# Altium footprint library Gate Driver Board.PcbLib: 123 footprints (part 1 of 8)
Each footprint in its own frame and in the unit in brackets; x right, y up, seen from the top. Pads: shape width x height; smd on the part's side, far side on the other; paste and mask are expansions set on the pad; w line width, h text height; cw(c..) or ccw(c..) is an arc to the next point about the centre after c.
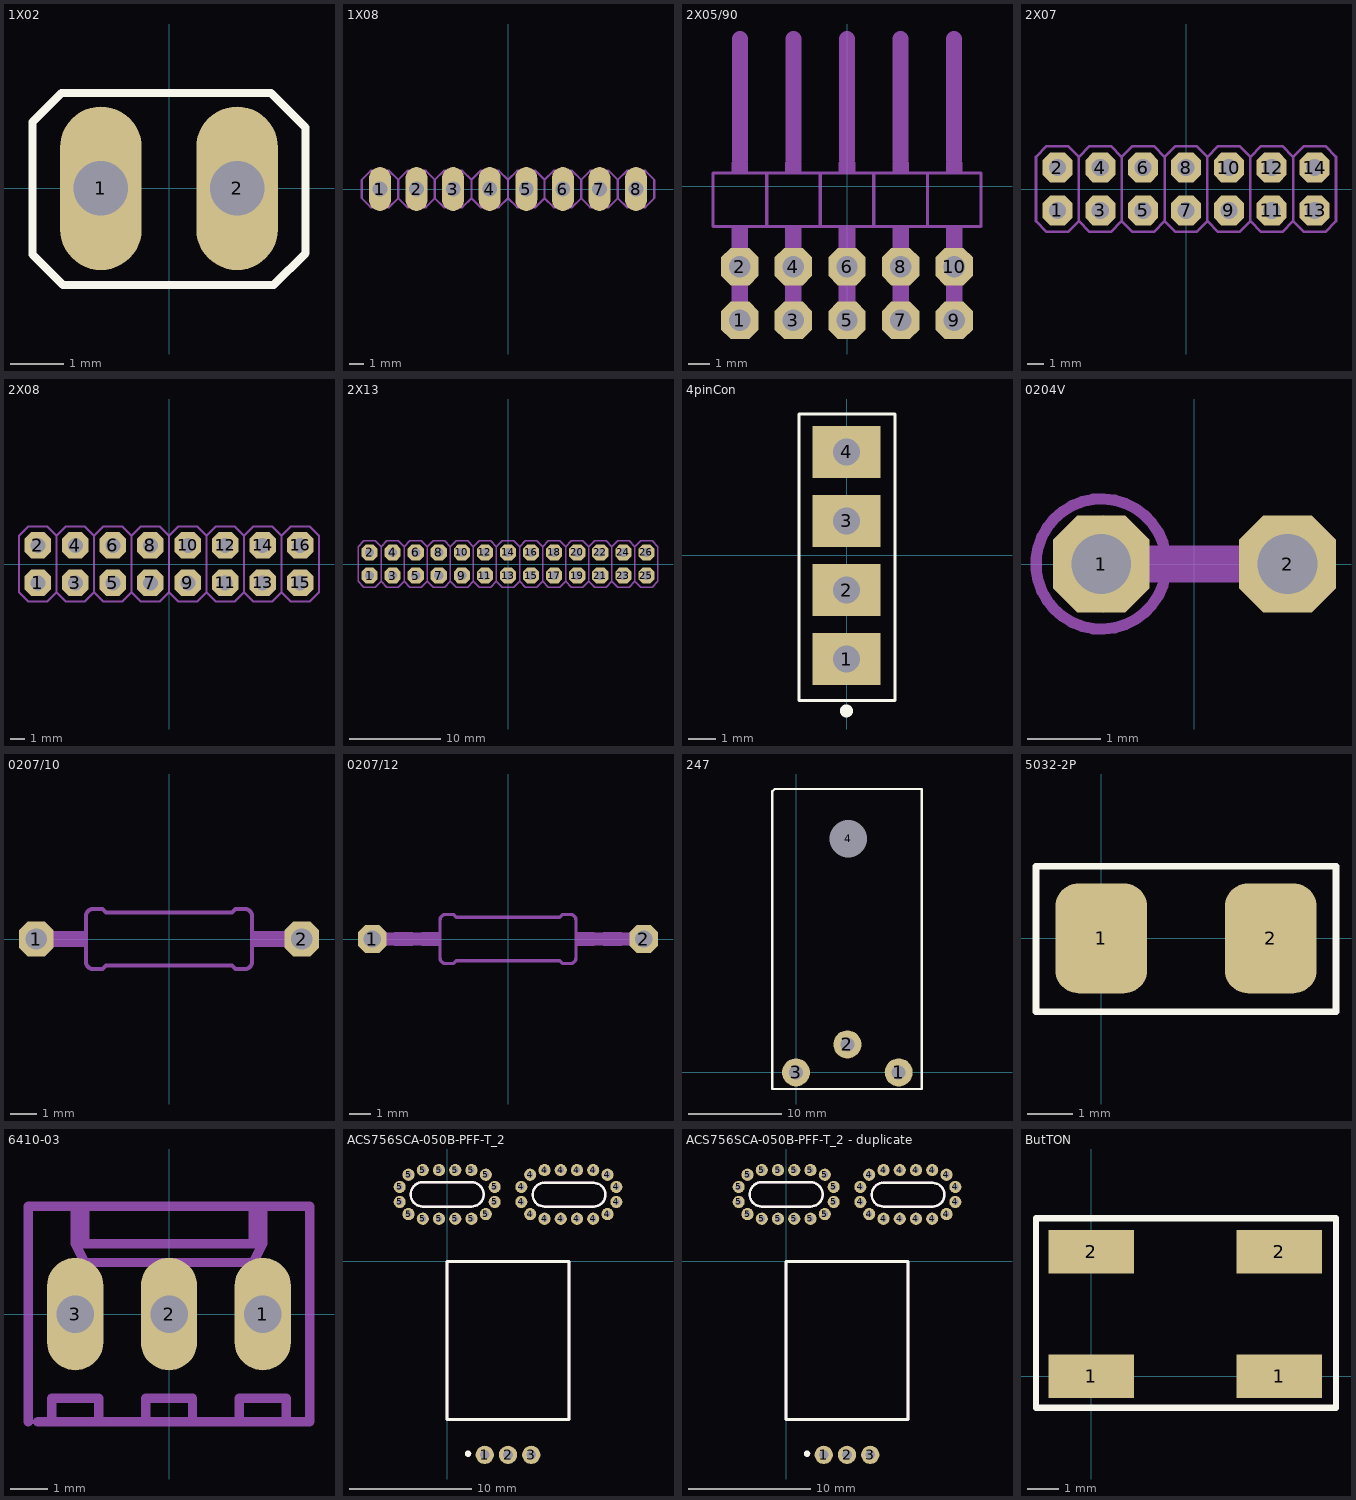
[diagram p0: the footprints below, top view; thin cyan lines are the x and y axes]

## 1X02 [mil] "1X02"
pads (2):
  oval 60x120 / inner round 0 / far side oval 60x120 hole 40: 1(-50,0) 2(50,0)
Top Overlay:
  lines w6: -100,-48.62 -100,48.62 -78.74,69.88 74.8,69.88 100,44.69 100,-47.64 76.77,-70.87 -65.94,-70.87 -77.76,-70.87 -100,-48.62
Assembly Bottom:
  region: -60,-10 -60,10 -40,10 -40,-10
  region: 40,-10 40,10 60,10 60,-10
3D body: height 150, standoff 0, extent -60,-10 -40,10
3D body: height 150, standoff 0, extent 40,-10 60,10
3D body: height 50, standoff 0, extent -80.26,-60.26 -19.74,60.26
3D body: height 50, standoff 0, extent 19.74,-60.26 80.26,60.26

## 1X08 [mil] "1X08"
pads (8):
  oval 60x120 / inner round 0 / far side oval 60x120 hole 40: 1(-350,0) 2(-250,0) 3(-150,0) 4(-50,0) 5(50,0) 6(150,0) 7(250,0) 8(350,0)
Assembly Bottom:
  region: 340,-10 340,10 360,10 360,-10
  region: -360,-10 -360,10 -340,10 -340,-10
  region: -260,-10 -260,10 -240,10 -240,-10
  region: -160,-10 -160,10 -140,10 -140,-10
  region: -60,-10 -60,10 -40,10 -40,-10
  region: 40,-10 40,10 60,10 60,-10
  region: 140,-10 140,10 160,10 160,-10
  region: 240,-10 240,10 260,10 260,-10
3D Body Bottom:
  lines w6: -300,-25 -275,-50 -225,-50 -200,-25 ; -300,-25 -325,-50 -375,-50 -400,-25 -400,25 -375,50 -325,50 -300,25 ; -300,-25 -300,25 ; -300,25 -275,50 -225,50 -200,25 ; -200,-25 -200,25 ; -200,-25 -175,-50 -125,-50 -100,-25 ; -200,25 -175,50 -125,50 -100,25 ; -100,-25 -75,-50 -25,-50 0,-25 ; -100,-25 -100,25 ; -100,25 -75,50 -25,50 0,25 ; 0,-25 25,-50 75,-50 100,-25 ; 0,-25 0,25 ; 0,25 25,50 75,50 100,25 ; 100,-25 100,25 ; 100,-25 125,-50 175,-50 200,-25 ; 100,25 125,50 175,50 200,25 ; 200,-25 225,-50 275,-50 300,-25 ; 200,-25 200,25 ; 200,25 225,50 275,50 300,25 ; 300,-25 325,-50 375,-50 400,-25 400,25 375,50 325,50 300,25 ; 300,-25 300,25
3D body: height 50, standoff 0, extent 319.74,-60.26 380.26,60.26
3D body: height 50, standoff 0, extent 219.74,-60.26 280.26,60.26
3D body: height 50, standoff 0, extent 119.74,-60.26 180.26,60.26
3D body: height 50, standoff 0, extent 19.74,-60.26 80.26,60.26
3D body: height 50, standoff 0, extent -80.26,-60.26 -19.74,60.26
3D body: height 50, standoff 0, extent -180.26,-60.26 -119.74,60.26
3D body: height 50, standoff 0, extent -280.26,-60.26 -219.74,60.26
3D body: height 50, standoff 0, extent -380.26,-60.26 -319.74,60.26
3D body: height 150, standoff 0, extent 340,-10 360,10
3D body: height 150, standoff 0, extent -360,-10 -340,10
3D body: height 150, standoff 0, extent -260,-10 -240,10
3D body: height 150, standoff 0, extent -160,-10 -140,10
3D body: height 150, standoff 0, extent -60,-10 -40,10
3D body: height 150, standoff 0, extent 40,-10 60,10
3D body: height 150, standoff 0, extent 140,-10 160,10
3D body: height 150, standoff 0, extent 240,-10 260,10

## 2X05/90 [mil] "2X05/90"
pads (10):
  oct 70x70 / inner round 0 / far side oct 70x70 hole 40: 1(-200,-250) 2(-200,-150) 3(-100,-250) 4(-100,-150) 5(0,-250) 6(0,-150) 7(100,-250) 8(100,-150) 9(200,-250) 10(200,-150)
Assembly Bottom:
  region: 185,-185 185,-115 215,-115 215,-185
  region: 85,-185 85,-115 115,-115 115,-185
  region: -15,-185 -15,-115 15,-115 15,-185
  region: -115,-185 -115,-115 -85,-115 -85,-185
  region: -215,-185 -215,-115 -185,-115 -185,-185
3D Body Bottom:
  region: 185,-215 185,-185 215,-185 215,-215
  region: 185,-115 185,-75 215,-75 215,-115
  region: 85,-215 85,-185 115,-185 115,-215
  region: -15,-215 -15,-185 15,-185 15,-215
  region: 85,-115 85,-75 115,-75 115,-115
  region: -15,-115 -15,-75 15,-75 15,-115
  region: -115,-215 -115,-185 -85,-185 -85,-215
  region: -215,-215 -215,-185 -185,-185 -185,-215
  region: -115,-115 -115,-75 -85,-75 -85,-115
  region: -215,-115 -215,-75 -185,-75 -185,-115
  region: 185,25 185,45 215,45 215,25
  region: 85,25 85,45 115,45 115,25
  region: -15,25 -15,45 15,45 15,25
  region: -115,25 -115,45 -85,45 -85,25
  region: -215,25 -215,45 -185,45 -185,25
  lines w6: -150,-75 -50,-75 ; -150,-75 -150,25 ; -150,-75 -250,-75 -250,25 -150,25 ; -150,25 -50,25 ; -50,-75 50,-75 ; -50,-75 -50,25 ; -50,25 50,25 ; 50,-75 150,-75 ; 50,-75 50,25 ; 50,25 150,25 ; 150,-75 250,-75 250,25 150,25 ; 150,-75 150,25
  lines w30: -200,50 -200,275 ; -100,50 -100,275 ; 0,50 0,275 ; 100,50 100,275 ; 200,50 200,275

## 2X07 [mil] "2X07"
pads (14):
  oct 70x70 / inner round 0 / far side oct 70x70 hole 40: 1(-300,-50) 2(-300,50) 3(-200,-50) 4(-200,50) 5(-100,-50) 6(-100,50) 7(0,-50) 8(0,50) 9(100,-50) 10(100,50) 11(200,-50) 12(200,50) 13(300,-50) 14(300,50)
Assembly Bottom:
  region: 290,-60 290,-40 310,-40 310,-60
  region: 290,40 290,60 310,60 310,40
  region: 190,-60 190,-40 210,-40 210,-60
  region: 90,-60 90,-40 110,-40 110,-60
  region: -10,-60 -10,-40 10,-40 10,-60
  region: 190,40 190,60 210,60 210,40
  region: 90,40 90,60 110,60 110,40
  region: -10,40 -10,60 10,60 10,40
  region: -110,-60 -110,-40 -90,-40 -90,-60
  region: -110,40 -110,60 -90,60 -90,40
  region: -210,-60 -210,-40 -190,-40 -190,-60
  region: -210,40 -210,60 -190,60 -190,40
  region: -310,40 -310,60 -290,60 -290,40
  region: -310,-60 -310,-40 -290,-40 -290,-60
3D Body Bottom:
  lines w6: -250,-75 -250,75 ; -250,-75 -225,-100 -175,-100 -150,-75 ; -250,-75 -275,-100 -325,-100 -350,-75 -350,75 -325,100 -275,100 -250,75 ; -250,75 -225,100 -175,100 -150,75 ; -150,-75 -150,75 ; -150,-75 -125,-100 -75,-100 -50,-75 ; -150,75 -125,100 -75,100 -50,75 ; -50,-75 -50,75 ; -50,-75 -25,-100 25,-100 50,-75 ; -50,75 -25,100 25,100 50,75 ; 50,-75 50,75 ; 50,-75 75,-100 125,-100 150,-75 ; 50,75 75,100 125,100 150,75 ; 150,-75 150,75 ; 150,-75 175,-100 225,-100 250,-75 ; 150,75 175,100 225,100 250,75 ; 250,-75 275,-100 325,-100 350,-75 350,75 325,100 275,100 250,75 ; 250,-75 250,75

## 2X08 [mil] "2X08"
pads (16):
  oct 70x70 / inner round 0 / far side oct 70x70 hole 40: 1(-350,-50) 2(-350,50) 3(-250,-50) 4(-250,50) 5(-150,-50) 6(-150,50) 7(-50,-50) 8(-50,50) 9(50,-50) 10(50,50) 11(150,-50) 12(150,50) 13(250,-50) 14(250,50) 15(350,-50) 16(350,50)
Assembly Bottom:
  region: 340,-60 340,-40 360,-40 360,-60
  region: 340,40 340,60 360,60 360,40
  region: 240,-60 240,-40 260,-40 260,-60
  region: 240,40 240,60 260,60 260,40
  region: 140,-60 140,-40 160,-40 160,-60
  region: 40,-60 40,-40 60,-40 60,-60
  region: -60,-60 -60,-40 -40,-40 -40,-60
  region: 140,40 140,60 160,60 160,40
  region: 40,40 40,60 60,60 60,40
  region: -60,40 -60,60 -40,60 -40,40
  region: -160,-60 -160,-40 -140,-40 -140,-60
  region: -160,40 -160,60 -140,60 -140,40
  region: -260,-60 -260,-40 -240,-40 -240,-60
  region: -260,40 -260,60 -240,60 -240,40
  region: -360,40 -360,60 -340,60 -340,40
  region: -360,-60 -360,-40 -340,-40 -340,-60
3D Body Bottom:
  lines w6: -300,-75 -300,75 ; -300,-75 -275,-100 -225,-100 -200,-75 ; -300,-75 -325,-100 -375,-100 -400,-75 -400,75 -375,100 -325,100 -300,75 ; -300,75 -275,100 -225,100 -200,75 ; -200,-75 -200,75 ; -200,-75 -175,-100 -125,-100 -100,-75 ; -200,75 -175,100 -125,100 -100,75 ; -100,-75 -100,75 ; -100,-75 -75,-100 -25,-100 0,-75 ; -100,75 -75,100 -25,100 0,75 ; 0,-75 0,75 ; 0,-75 25,-100 75,-100 100,-75 ; 0,75 25,100 75,100 100,75 ; 100,-75 100,75 ; 100,-75 125,-100 175,-100 200,-75 ; 100,75 125,100 175,100 200,75 ; 200,-75 200,75 ; 200,-75 225,-100 275,-100 300,-75 ; 200,75 225,100 275,100 300,75 ; 300,-75 325,-100 375,-100 400,-75 400,75 375,100 325,100 300,75 ; 300,-75 300,75

## 2X13 [mil] "2X13"
pads (26):
  oct 70x70 / inner round 0 / far side oct 70x70 hole 40: 1(-600,-50) 2(-600,50) 3(-500,-50) 4(-500,50) 5(-400,-50) 6(-400,50) 7(-300,-50) 8(-300,50) 9(-200,-50) 10(-200,50) 11(-100,-50) 12(-100,50) 13(0,-50) 14(0,50) 15(100,-50) 16(100,50) 17(200,-50) 18(200,50) 19(300,-50) 20(300,50) 21(400,-50) 22(400,50) 23(500,-50) 24(500,50) 25(600,-50) 26(600,50)
3D Body Bottom:
  drawing of 118 lines, arcs and shapes, not listed

## 4pinCon [mm]
pads (4):
  rect 2.5x1.9 hole 1: 1(0,-3.81) 2(0,-1.27) 3(0,1.27) 4(0,3.81)
Top Overlay:
  circle w0.254: c-0.007,-5.72 r0.113
  lines w0.1: -1.75,-5.334 -1.75,5.207 1.778,5.207 1.778,-5.334 0.515,-5.334 -0.487,-5.334 -1.75,-5.334
3D body "User Library-SIP_header_2_54mm_4pin.STEP": height 4.94, standoff -2.26, extent -1.175,-4.953 1.397,5.207

## 0204V [mil] "0204V"
pads (2):
  oct 52x52 / inner round 0 / far side oct 52x52 hole 32: 1(-50,0) 2(50,0)
Assembly Bottom:
  circle w2: c-50,0 r25
  circle w6: c-50,0 r35
  lines w20: -50,0 50,0
3D Body Bottom:
  lines w20: -5,0 5,0
3D body: height 50, standoff 0, extent 25.51,-24.49 74.49,24.49
3D body: height 50, standoff 0, extent -74.49,-24.49 -25.51,24.49
3D body: height 150, standoff 0, extent -76.22,-26.22 -23.78,26.22
3D body: height 150, standoff 0, extent -88.33,-38.33 -11.67,38.33
3D body: height 150, standoff 0, extent -60.2,-10.2 60.2,10.2

## 0207/10 [mil] "0207/10"
pads (2):
  oct 52x52 / inner round 0 / far side oct 52x52 hole 32: 1(-200,0) 2(200,0)
Assembly Bottom:
  lines w24: -200,0 -160,0 ; 160,0 200,0
3D Body Bottom:
  region: -159,-12 -159,12 -125,12 -125,-12
  region: 125,-12 125,12 159,12 159,-12
  lines w6: -125,-35 ccw(c-115,-35) -115,-45 -100,-45 -95,-40 95,-40 100,-45 115,-45 ccw(c115,-35) 125,-35 125,35 ccw(c115,35) 115,45 100,45 95,40 -95,40 -100,45 -115,45 ccw(c-115,35) -125,35 -125,-35
3D body: height 50, standoff 0, extent 175.51,-24.49 224.49,24.49
3D body: height 50, standoff 0, extent -224.49,-24.49 -175.51,24.49
3D body: height 150, standoff 0, extent -212.24,-12.24 -147.76,12.24
3D body: height 150, standoff 0, extent 147.76,-12.24 212.24,12.24

## 0207/12 [mil] "0207/12"
pads (2):
  oct 52x52 / inner round 0 / far side oct 52x52 hole 32: 1(-250,0) 2(250,0)
Assembly Bottom:
  lines w24: -250,0 -210,0 ; 210,0 250,0
3D Body Bottom:
  region: 125,-12 125,12 159,12 159,-12
  region: -159,-12 -159,12 -125,12 -125,-12
  region: 175,-12 175,12 209,12 209,-12
  region: -209,-12 -209,12 -175,12 -175,-12
  lines w6: -125,-35 ccw(c-115,-35) -115,-45 -100,-45 -95,-40 95,-40 100,-45 115,-45 ccw(c115,-35) 125,-35 125,35 ccw(c115,35) 115,45 100,45 95,40 -95,40 -100,45 -115,45 ccw(c-115,35) -125,35 -125,-35
  lines w24: -175,0 -160,0 ; 160,0 175,0
3D body: height 150, standoff 0, extent 197.76,-12.24 262.24,12.24
3D body: height 150, standoff 0, extent -262.24,-12.24 -197.76,12.24
3D body: height 50, standoff 0, extent -274.49,-24.49 -225.51,24.49
3D body: height 50, standoff 0, extent 225.51,-24.49 274.49,24.49

## 247 [mm]
pads (4):
  round 3 hole 1.5: 1(11,0) 2(5.5,3) 3(0,0)
  round 1.524 hole 4: 4(5.588,25.019)
Top Overlay:
  circle w0.254: c5.588,25.019 r1.55
  lines w0.254: -2.54,-1.778 0.349,-1.778 13.462,-1.778 13.462,30.353 -2.286,30.353 -2.54,30.099 -2.54,-1.778
3D body "TO-247_horizontal_back_triangle_margin.stp": height 5.01, standoff -3.59, extent -2.286,-0.314 13.314,30.286

## 5032-2P [mm]
pads (2):
  rrect50% 2x2.4 smd: 1(0,0) 2(3.7,0)
Top Overlay:
  lines w0.15: -1.425,-1.6 -1.425,1.575 5.125,1.575 5.125,-1.6 -1.425,-1.6
3D body "User Library-ABM3-1.STEP": height 1.3, standoff 0, extent -0.7,-1.575 4.3,1.625

## 6410-03 [mil] "6410-03"
pads (3):
  oval 60x120 / inner round 0 / far side oval 60x120 hole 40: 1(100,0) 2(0,0) 3(-100,0)
Assembly Bottom:
  region: -110,-10 -110,10 -90,10 -90,-10
  region: -10,-10 -10,10 10,10 10,-10
  region: 90,-10 90,10 110,10 110,-10
3D Body Bottom:
  lines w5: -150,-115 -50,-115 -25,-115 ; -100,100 -100,115 -90,115
  lines w10: -150,-115 -150,0 -150,115 -100,115 ; -140,-115 -125,-115 ; -90,115 -90,75 ; 90,115 90,75 ; 100,115 100,75 ; -125,-115 -125,-90 -75,-90 -75,-115 ; -125,-115 -75,-115 ; -100,75 -100,115 ; -100,75 -90,75 ; -100,75 -90,55 90,55 100,75 ; -100,115 -50,115 150,115 150,0 150,-115 125,-115 ; -90,75 90,75 ; -75,-115 -25,-115 ; -25,-115 25,-115 ; -25,-115 -25,-90 25,-90 25,-115 ; 25,-115 75,-115 ; 75,-115 125,-115 ; 75,-115 75,-90 125,-90 125,-115 ; 90,75 100,75
  text "1" at 173.94,-29.06 h77.5
  text "3" at -196.06,-27.06 h77.5
3D body: height 150, standoff 0, extent -110,-10 -90,10
3D body: height 150, standoff 0, extent -10,-10 10,10
3D body: height 150, standoff 0, extent 90,-10 110,10
3D body: height 50, standoff 0, extent -130.26,-60.26 -69.74,60.26
3D body: height 50, standoff 0, extent -30.26,-60.26 30.26,60.26
3D body: height 50, standoff 0, extent 69.74,-60.26 130.26,60.26

## ACS756SCA-050B-PFF-T_2 [mm]
pads (35):
  round 1.5 hole 0.8: 1(3.09,-15.9) 2(5,-15.9) 3(6.91,-15.9)
  round 1 hole 0.5: 4(6.098,4.882) 4(6.098,6.118) 4(6.824,3.882) 4(6.824,7.118) 4(8,3.5) 4(8,7.5) 4(9.333,3.5) 4(9.333,7.5) 4(10.667,3.5) 4(10.667,7.5) 4(12,3.5) 4(12,7.5) 4(13.176,3.882) 4(13.176,7.118) 4(13.902,4.882) 4(13.902,6.118) 5(-3.902,4.882) 5(-3.902,6.118) 5(-3.176,3.882) 5(-3.176,7.118) 5(-2,3.5) 5(-2,7.5) 5(-0.667,3.5) 5(-0.667,7.5) 5(0.667,3.5) 5(0.667,7.5) 5(2,3.5) 5(2,7.5) 5(3.176,3.882) 5(3.176,7.118) 5(3.902,4.882) 5(3.902,6.118)
Top Overlay:
  circle w0.254: c1.715,-15.803 r0.139
  lines w0.2: -2,4.5 cw(c-2,5.5) -2,6.5 2,6.5 cw(c2,5.5) 2,4.5 -2,4.5 ; 8,4.5 cw(c8,5.477) 8,6.455 12.057,6.455 cw(c12.028,5.477) 12.057,4.5 8,4.5
  lines w0.254: 0,-13 10,-13 10,0 0,0 0,-13
Mechanical 13:
  lines w0.2: -2,4.5 cw(c-2,5.5) -2,6.5 2,6.5 cw(c2,5.5) 2,4.5 -2,4.5 ; 8,4.5 cw(c8,5.477) 8,6.455 12.057,6.455 cw(c12.028,5.478) 12.057,4.5 8,4.5
  lines w0.254: 0,-13 10,-13 10,0 0,0 0,-13
3D body "User Library-ACS758-1.STEP": height 7, standoff -3.5, extent -1.95,-16.371 12.05,6.271

## ACS756SCA-050B-PFF-T_2 - duplicate [mm]
pads (35):
  round 1.5 hole 0.8: 1(3.09,-15.9) 2(5,-15.9) 3(6.91,-15.9)
  round 1 hole 0.5: 4(6.098,4.882) 4(6.098,6.118) 4(6.824,3.882) 4(6.824,7.118) 4(8,3.5) 4(8,7.5) 4(9.333,3.5) 4(9.333,7.5) 4(10.667,3.5) 4(10.667,7.5) 4(12,3.5) 4(12,7.5) 4(13.176,3.882) 4(13.176,7.118) 4(13.902,4.882) 4(13.902,6.118) 5(-3.902,4.882) 5(-3.902,6.118) 5(-3.176,3.882) 5(-3.176,7.118) 5(-2,3.5) 5(-2,7.5) 5(-0.667,3.5) 5(-0.667,7.5) 5(0.667,3.5) 5(0.667,7.5) 5(2,3.5) 5(2,7.5) 5(3.176,3.882) 5(3.176,7.118) 5(3.902,4.882) 5(3.902,6.118)
Top Overlay:
  circle w0.254: c1.715,-15.803 r0.139
  lines w0.2: -2,4.5 cw(c-2,5.5) -2,6.5 2,6.5 cw(c2,5.5) 2,4.5 -2,4.5 ; 8,4.5 cw(c8,5.477) 8,6.455 12.057,6.455 cw(c12.028,5.477) 12.057,4.5 8,4.5
  lines w0.254: 0,-13 10,-13 10,0 0,0 0,-13
Mechanical 13:
  lines w0.2: -2,4.5 cw(c-2,5.5) -2,6.5 2,6.5 cw(c2,5.5) 2,4.5 -2,4.5 ; 8,4.5 cw(c8,5.477) 8,6.455 12.057,6.455 cw(c12.028,5.478) 12.057,4.5 8,4.5
  lines w0.254: 0,-13 10,-13 10,0 0,0 0,-13

## ButTON [mm]
pads (4):
  rect 2.75x1.4 smd: 1(0,0) 1(6.05,0) 2(0,4) 2(6.05,4)
Top Overlay:
  lines w0.2: -1.778,-1.016 7.874,-1.016 7.874,5.08 -1.778,5.08 -1.778,-1.016
3D body "Tactal Switch - SMD (6mmx 6mmx 9mm) - Marked.stp": height 9, standoff 0, extent -1.461,-0.984 7.556,5.048